# Altium footprint library soldeerstation.PcbLib: 86 footprints (part 2 of 6)
Each footprint in its own frame and in the unit in brackets; x right, y up, seen from the top. Pads: shape width x height; smd on the part's side, far side on the other; paste and mask are expansions set on the pad; w line width, h text height; cw(c..) or ccw(c..) is an arc to the next point about the centre after c.
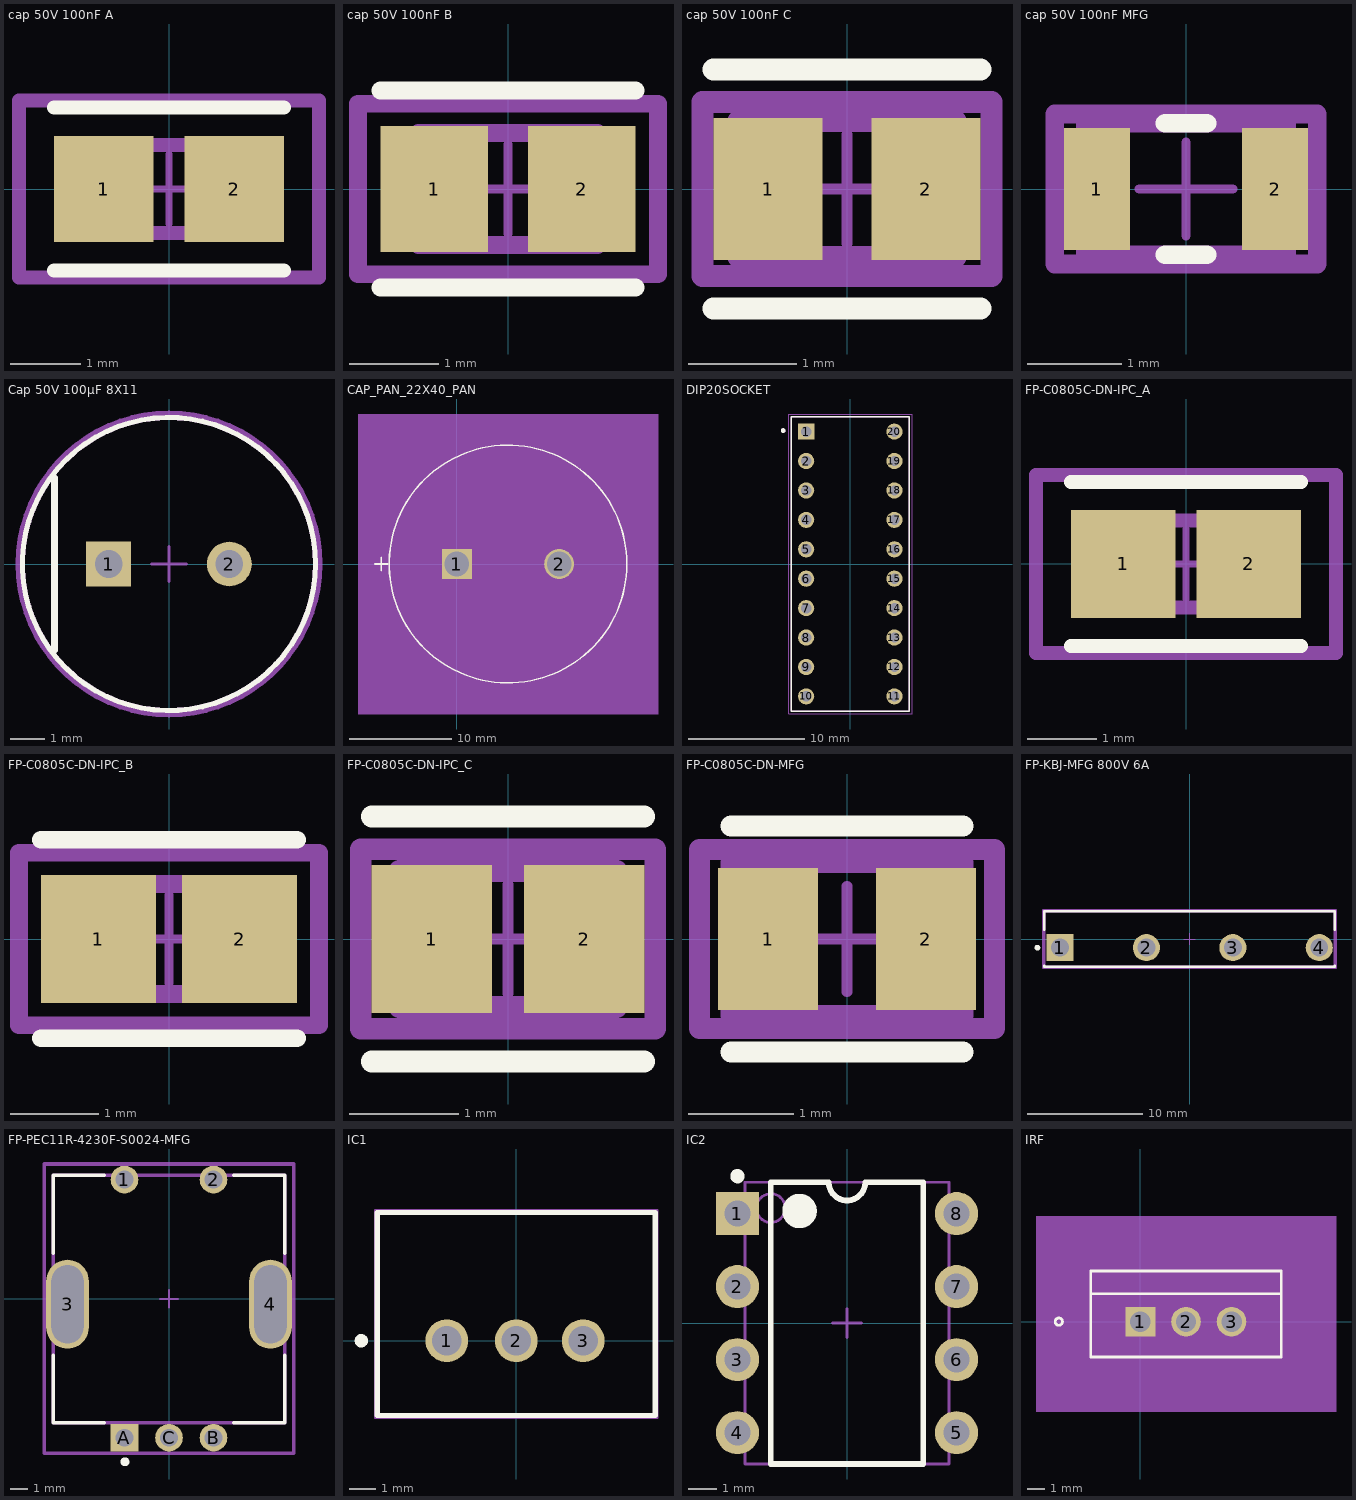
[diagram p1: the footprints below, top view; thin cyan lines are the x and y axes]

## cap 50V 100nF A [mm]
pads (2):
  rect 1.406x1.508 smd paste+0 mask+0: 1(-0.926,0) 2(0.926,0)
Top Overlay:
  lines w0.2: -1.629,-1.154 1.629,-1.154 ; -1.629,1.154 1.629,1.154
Top 3D Body:
  lines w0.2: -1,-0.625 -1,0.625 1,0.625 1,-0.625 -1,-0.625
Top Courtyard:
  lines w0.2: -2.129,-1.254 -2.129,1.254 2.129,1.254 2.129,-1.254 -2.129,-1.254
Top Assembly:
  lines w0.2: -2.129,-1.254 -2.129,1.254 2.129,1.254 2.129,-1.254 -2.129,-1.254
  text ".Designator" at 0,0.187 h1
Top Component Center:
  lines w0.1: -0.5,0 0.5,0 ; 0,-0.5 0,0.5
3D body "Cap_Murata_GCD21BR71H823KA01L_eec.STEP": height 0.25, standoff 0, extent -2.129,-1.254 2.129,1.254

## cap 50V 100nF B [mm]
pads (2):
  rect 1.206x1.408 smd paste+0 mask+0: 1(-0.826,0) 2(0.826,0)
Top Overlay:
  lines w0.2: -1.429,-1.104 1.429,-1.104 ; -1.429,1.104 1.429,1.104
Top 3D Body:
  lines w0.2: -1,-0.625 1,-0.625 1,0.625 -1,0.625 -1,-0.625
Top Courtyard:
  lines w0.2: -1.679,-0.954 1.679,-0.954 1.679,0.954 -1.679,0.954 -1.679,-0.954
Top Assembly:
  lines w0.2: -1.679,-0.954 1.679,-0.954 1.679,0.954 -1.679,0.954 -1.679,-0.954
  text ".Designator" at 0,0.187 h1
Top Component Center:
  lines w0.1: -0.5,0 0.5,0 ; 0,-0.5 0,0.5
3D body "Cap_Murata_GCD21BR71H823KA01L_eec.STEP": height 0.25, standoff 0, extent -1.679,-0.954 1.679,0.954

## cap 50V 100nF C [mm]
pads (2):
  rect 1.006x1.308 smd paste+0 mask+0: 1(-0.726,0) 2(0.726,0)
Top Overlay:
  lines w0.2: -1.229,-1.1 1.229,-1.1 ; -1.229,1.1 1.229,1.1
Top 3D Body:
  lines w0.2: -1,-0.625 1,-0.625 1,0.625 -1,0.625 -1,-0.625
Top Courtyard:
  lines w0.2: -1.329,-0.8 1.329,-0.8 1.329,0.8 -1.329,0.8 -1.329,-0.8
Top Assembly:
  lines w0.2: -1.329,-0.8 1.329,-0.8 1.329,0.8 -1.329,0.8 -1.329,-0.8
  text ".Designator" at 0,0.187 h1
Top Component Center:
  lines w0.1: -0.5,0 0.5,0 ; 0,-0.5 0,0.5
3D body "Cap_Murata_GCD21BR71H823KA01L_eec.STEP": height 0.25, standoff 0, extent -1.329,-0.8 1.329,0.8

## cap 50V 100nF MFG [mm]
pads (2):
  rect 0.7x1.3 smd paste+0 mask+0: 1(-0.95,0) 2(0.95,0)
Top Overlay:
  lines w0.2: -0.225,-0.7 0.225,-0.7 ; -0.225,0.7 0.225,0.7
Top 3D Body:
  lines w0.2: -1.075,-0.7 1.075,-0.7 1.075,0.7 -1.075,0.7 -1.075,-0.7
Top Courtyard:
  lines w0.2: -1.4,-0.8 1.4,-0.8 1.4,0.8 -1.4,0.8 -1.4,-0.8
Top Assembly:
  lines w0.2: -1.4,-0.8 1.4,-0.8 1.4,0.8 -1.4,0.8 -1.4,-0.8
  text ".Designator" at 0,0.187 h1
Top Component Center:
  lines w0.1: -0.5,0 0.5,0 ; 0,-0.5 0,0.5
3D body "Cap_Murata_GCD21BR71H823KA01L_eec.STEP": height 0.25, standoff 0, extent -1.4,-0.8 1.4,0.8

## Cap 50V 100µF 8X11 [mm]
pads (2):
  rect 1.3x1.3 hole 0.8 paste-1000 mask+0: 1(-1.75,0)
  round 1.3 hole 0.8 paste-1000 mask+0: 2(1.75,0)
Top Overlay:
  circle w0.15: c0,0 r4.25
  lines w0.2: -3.325,-2.5 -3.325,2.5
Top 3D Body:
  circle w0.15: c0,0 r4.25
Top Courtyard:
  lines w0.2: -4.35,0 cw(c0,0) 4.35,0 cw(c0,0) -4.35,0
Top Assembly:
  text ".Designator" at 0,0.187 h1
Top Component Center:
  lines w0.1: -0.5,0 0.5,0 ; 0,-0.5 0,0.5
3D body "Cap_Panasonic_EEUFK1V181_eec.STEP": height 0.25, standoff 0, extent -4.35,-4.35 4.35,4.35

## CAP_PAN_22X40_PAN [mil]
pads (2):
  rect 115x115 hole 95 mask+0: 1(0,0)
  round 115 hole 95 mask+0: 2(394,0)
Top Overlay:
  circle w6: c197,0 r458
  lines w6: -316,0 -266,0 ; -291,-25 -291,25
Top Assembly:
  region: 775,-578 -381,-578 -381,578 775,578
Mechanical 13:
  circle w0: c197,0 r453
  lines w1: -316,0 -266,0 ; -291,-25 -291,25
Mechanical 15:
  region: -266,190.65 6.35,463 387.65,463 660,190.65 660,-190.65 387.65,-463 6.35,-463 -266,-190.65
  lines w1: -266,-190.65 -266,190.65 6.35,463 387.65,463 660,190.65 660,-190.65 387.65,-463 6.35,-463 -266,-190.65
3D body "CAP_PAN_22X40_PAN.step": height 1654.61, standoff -355, extent -255.98,-453 650.43,453

## DIP20SOCKET [mil]
pads (20):
  rect 55x55 hole 35: 1(-150,450)
  round 55 hole 35: 2(-150,350) 3(-150,250) 4(-150,150) 5(-150,50) 6(-150,-50) 7(-150,-150) 8(-150,-250) 9(-150,-350) 10(-150,-450) 11(150,-450) 12(150,-350) 13(150,-250) 14(150,-150) 15(150,-50) 16(150,50) 17(150,150) 18(150,250) 19(150,350) 20(150,450)
Top Overlay:
  circle w7.87: c-228.35,453.54 r3.94
  lines w5: -200,-500 200,-500 200,500 -200,500 -200,-500
Mechanical 13:
  circle w7.87: c-228.35,453.54 r3.94
  lines w5: -200,-500 200,-500 200,500 -200,500 -200,-500
Mechanical 15:
  lines w1.97: -209.84,-509.84 209.84,-509.84 209.84,509.84 -209.84,509.84 -209.84,-509.84

## FP-C0805C-DN-IPC_A [mm]
pads (2):
  rect 1.505x1.556 smd paste+0 mask+0: 1(-0.901,0) 2(0.901,0)
Top Overlay:
  lines w0.2: -1.653,-1.178 1.653,-1.178 ; -1.653,1.178 1.653,1.178
Top 3D Body:
  lines w0.2: -1,-0.625 -1,0.625 1,0.625 1,-0.625 -1,-0.625
Top Courtyard:
  lines w0.2: -2.153,-1.278 -2.153,1.278 2.153,1.278 2.153,-1.278 -2.153,-1.278
Top Assembly:
  lines w0.2: -2.153,-1.278 -2.153,1.278 2.153,1.278 2.153,-1.278 -2.153,-1.278
  text ".Designator" at 0,0.187 h1
Top Component Center:
  lines w0.1: -0.5,0 0.5,0 ; 0,-0.5 0,0.5
3D body "Cap_KEMET_C0805C472J3HAC_eec.STEP": height 0.25, standoff 0, extent -2.153,-1.278 2.153,1.278

## FP-C0805C-DN-IPC_B [mm]
pads (2):
  rect 1.305x1.456 smd paste+0 mask+0: 1(-0.801,0) 2(0.801,0)
Top Overlay:
  lines w0.2: -1.453,-1.128 1.453,-1.128 ; -1.453,1.128 1.453,1.128
Top 3D Body:
  lines w0.2: -1,-0.625 1,-0.625 1,0.625 -1,0.625 -1,-0.625
Top Courtyard:
  lines w0.2: -1.703,-0.978 1.703,-0.978 1.703,0.978 -1.703,0.978 -1.703,-0.978
Top Assembly:
  lines w0.2: -1.703,-0.978 1.703,-0.978 1.703,0.978 -1.703,0.978 -1.703,-0.978
  text ".Designator" at 0,0.187 h1
Top Component Center:
  lines w0.1: -0.5,0 0.5,0 ; 0,-0.5 0,0.5
3D body "Cap_KEMET_C0805C472J3HAC_eec.STEP": height 0.25, standoff 0, extent -1.703,-0.978 1.703,0.978

## FP-C0805C-DN-IPC_C [mm]
pads (2):
  rect 1.105x1.356 smd paste+0 mask+0: 1(-0.701,0) 2(0.701,0)
Top Overlay:
  lines w0.2: -1.253,-1.125 1.253,-1.125 ; -1.253,1.125 1.253,1.125
Top 3D Body:
  lines w0.2: -1,-0.625 1,-0.625 1,0.625 -1,0.625 -1,-0.625
Top Courtyard:
  lines w0.2: -1.353,-0.825 1.353,-0.825 1.353,0.825 -1.353,0.825 -1.353,-0.825
Top Assembly:
  lines w0.2: -1.353,-0.825 1.353,-0.825 1.353,0.825 -1.353,0.825 -1.353,-0.825
  text ".Designator" at 0,0.187 h1
Top Component Center:
  lines w0.1: -0.5,0 0.5,0 ; 0,-0.5 0,0.5
3D body "Cap_KEMET_C0805C472J3HAC_eec.STEP": height 0.25, standoff 0, extent -1.353,-0.825 1.353,0.825

## FP-C0805C-DN-MFG [mm]
pads (2):
  rect 0.95x1.35 smd paste+0 mask+0: 1(-0.75,0) 2(0.75,0)
Top Overlay:
  lines w0.2: -1.1,-1.075 1.1,-1.075 ; -1.1,1.075 1.1,1.075
Top 3D Body:
  lines w0.2: -1.1,-0.725 -1.1,0.725 1.1,0.725 1.1,-0.725 -1.1,-0.725
Top Courtyard:
  lines w0.2: -1.4,-0.85 -1.4,0.85 1.4,0.85 1.4,-0.85 -1.4,-0.85
Top Assembly:
  lines w0.2: -1.4,-0.85 -1.4,0.85 1.4,0.85 1.4,-0.85 -1.4,-0.85
  text ".Designator" at 0,0.187 h1
Top Component Center:
  lines w0.1: -0.5,0 0.5,0 ; 0,-0.5 0,0.5
3D body "Cap_KEMET_C0805C472J3HAC_eec.STEP": height 0.25, standoff 0, extent -1.4,-0.85 1.4,0.85

## FP-KBJ-MFG 800V 6A [mm]
pads (4):
  rect 2.35x2.35 hole 1.55 paste-1000 mask+0: 1(-11.25,-0.75)
  round 2.35 hole 1.55 paste-1000 mask+0: 2(-3.75,-0.75) 3(3.75,-0.75) 4(11.25,-0.75)
Top Overlay:
  circle w0.25: c-13.2,-0.75 r0.125
  lines w0.2: -12.6,-2.3 -12.6,-2.4 12.6,-2.4 12.6,-2.3 ; -12.6,0.8 -12.6,2.4 12.6,2.4 12.6,0.8
Top 3D Body:
  lines w0.2: -12.6,-2.4 12.6,-2.4 12.6,2.4 -12.6,2.4 -12.6,-2.4
Top Courtyard:
  lines w0.2: -12.7,-2.5 12.7,-2.5 12.7,2.5 -12.7,2.5 -12.7,-2.5
Top Assembly:
  lines w0.2: -12.7,-2.5 12.7,-2.5 12.7,2.5 -12.7,2.5 -12.7,-2.5
  text ".Designator" at 0,0.187 h1
Top Component Center:
  lines w0.1: -0.5,0 0.5,0 ; 0,-0.5 0,0.5
3D body "Diode_Diodes_KBJ608G_eec.STEP": height 0.25, standoff 0, extent -12.7,-2.5 12.7,2.5

## FP-PEC11R-4230F-S0024-MFG [mm]
pads (7):
  round 1.55 hole 1 paste-1000 mask+0: 1(-2.5,6.7) 2(2.5,6.7) B(2.5,-7.8) C(0,-7.8)
  rrect100% 2.4x5 hole 4.4 slot 1.8 at 0 deg paste-1000 mask+0: 3(-5.7,-0.3) 4(5.7,-0.3)
  rect 1.55x1.55 hole 1 paste-1000 mask+0: A(-2.5,-7.8)
Top Overlay:
  circle w0.25: c-2.475,-9.15 r0.125
  lines w0.2: -6.5,-3.175 -6.5,-6.95 -3.65,-6.95 ; -6.5,2.575 -6.5,6.95 -3.65,6.95 ; 3.65,-6.95 6.5,-6.95 6.5,-3.175 ; 3.65,6.95 6.5,6.95 6.5,2.575
Top 3D Body:
  lines w0.2: -6.5,-6.95 6.5,-6.95 6.5,6.95 -6.5,6.95 -6.5,-6.95
Top Courtyard:
  lines w0.2: -7,-8.675 7,-8.675 7,7.575 -7,7.575 -7,-8.675
Top Assembly:
  lines w0.2: -7,-8.675 7,-8.675 7,7.575 -7,7.575 -7,-8.675
  text ".Designator" at 0,-0.363 h1
Top Component Center:
  lines w0.1: -0.5,0 0.5,0 ; 0,-0.5 0,0.5
3D body "Enc_Bourns_PEC11R-4230F-S0024_eec.STEP": height 0.25, standoff 0, extent -7,-8.675 7,7.575

## IC1 [mm] "THMT, 3-Leads, Body 10.4x7.6mm"
height 16.5
pads (3):
  round 1.6 hole 1.1: 1(-2.6,0) 2(0,0) 3(2.5,0)
Top Overlay:
  circle w0.25: c-5.8,0 r0.125
  lines w0.2: -5.2,-2.8 -5.2,4.8 5.2,4.8 5.2,-2.8 -5.2,-2.8
Mechanical 13:
  lines w0.1: -5.2,-2.8 5.2,-2.8 5.2,4.8 -5.2,4.8 -5.2,-2.8
Mechanical 15:
  lines w0.05: -5.3,-2.9 5.3,-2.9 5.3,4.9 -5.3,4.9 -5.3,-2.9
  lines w0.1: -0.5,0 0.5,0 ; 0,-0.5 0,0.5
3D body: height 16.5, standoff 0, extent -5.2,-2.8 5.2,4.8

## IC2 [mm] "8-Pin Plastic Dual In-Line Package (PDIP)"
height 5.34
pads (8):
  rect 1.5x1.5 hole 0.9: 1(-3.81,3.81)
  round 1.5 hole 0.9: 2(-3.81,1.27) 3(-3.81,-1.27) 4(-3.81,-3.81) 5(3.81,-3.81) 6(3.81,-1.27) 7(3.81,1.27) 8(3.81,3.81)
Top Overlay:
  circle w0.6: c-1.65,3.9 r0.3
  circle w0.25: c-3.81,5.11 r0.125
  lines w0.2: -2.65,-4.9 2.65,-4.9 2.65,4.9 0.635,4.9 cw(c0,4.9) -0.635,4.9 -2.65,4.9 -2.65,-4.9
Mechanical 13:
  circle w0.1: c-2.65,4 r0.5
  lines w0.1: -3.55,-4.9 3.55,-4.9 3.55,4.9 -3.55,4.9 -3.55,-4.9
Mechanical 15:
  lines w0.1: -0.5,0 0.5,0 ; 0,-0.5 0,0.5
3D body: height 4.32, standoff 0, extent -3.55,-4.9 3.55,4.9

## IRF [mil]
pads (3):
  rect 65x65 hole 45 mask+0: 1(0,0)
  round 65 hole 45 mask+0: 2(100,0) 3(200,0)
Top Overlay:
  circle w6: c-179.5,0 r8
  lines w6: -104.5,61.3 304.5,61.3 ; -109.5,-77.7 -109.5,111.3 309.5,111.3 309.5,-77.7 -109.5,-77.7
Top Assembly:
  region: -229.5,231.3 429.5,231.3 429.5,-197.7 -229.5,-197.7
Mechanical 13:
  circle w0: c-94.5,-62.7 r8
  lines w1: -104.5,56.3 304.5,56.3 ; -104.5,-72.7 -104.5,106.3 304.5,106.3 304.5,-72.7 -104.5,-72.7
  text "TAB" at 81.25,68.8 h25
Mechanical 15:
  region: 314.5,116.3 -114.5,116.3 -114.5,-82.7 314.5,-82.7
  lines w6: -114.5,-82.7 314.5,-82.7 314.5,116.3 -114.5,116.3 -114.5,-82.7
3D body "PG-TO220-3-904_INF.step": height 747.99, standoff -240, extent -104.49,-72.72 304.49,106.3